# Altium footprint library 集大电协1.5.PcbLib: 283 footprints (part 10 of 18)
Each footprint in its own frame and in the unit in brackets; x right, y up, seen from the top. Pads: shape width x height; smd on the part's side, far side on the other; paste and mask are expansions set on the pad; w line width, h text height; cw(c..) or ccw(c..) is an arc to the next point about the centre after c.
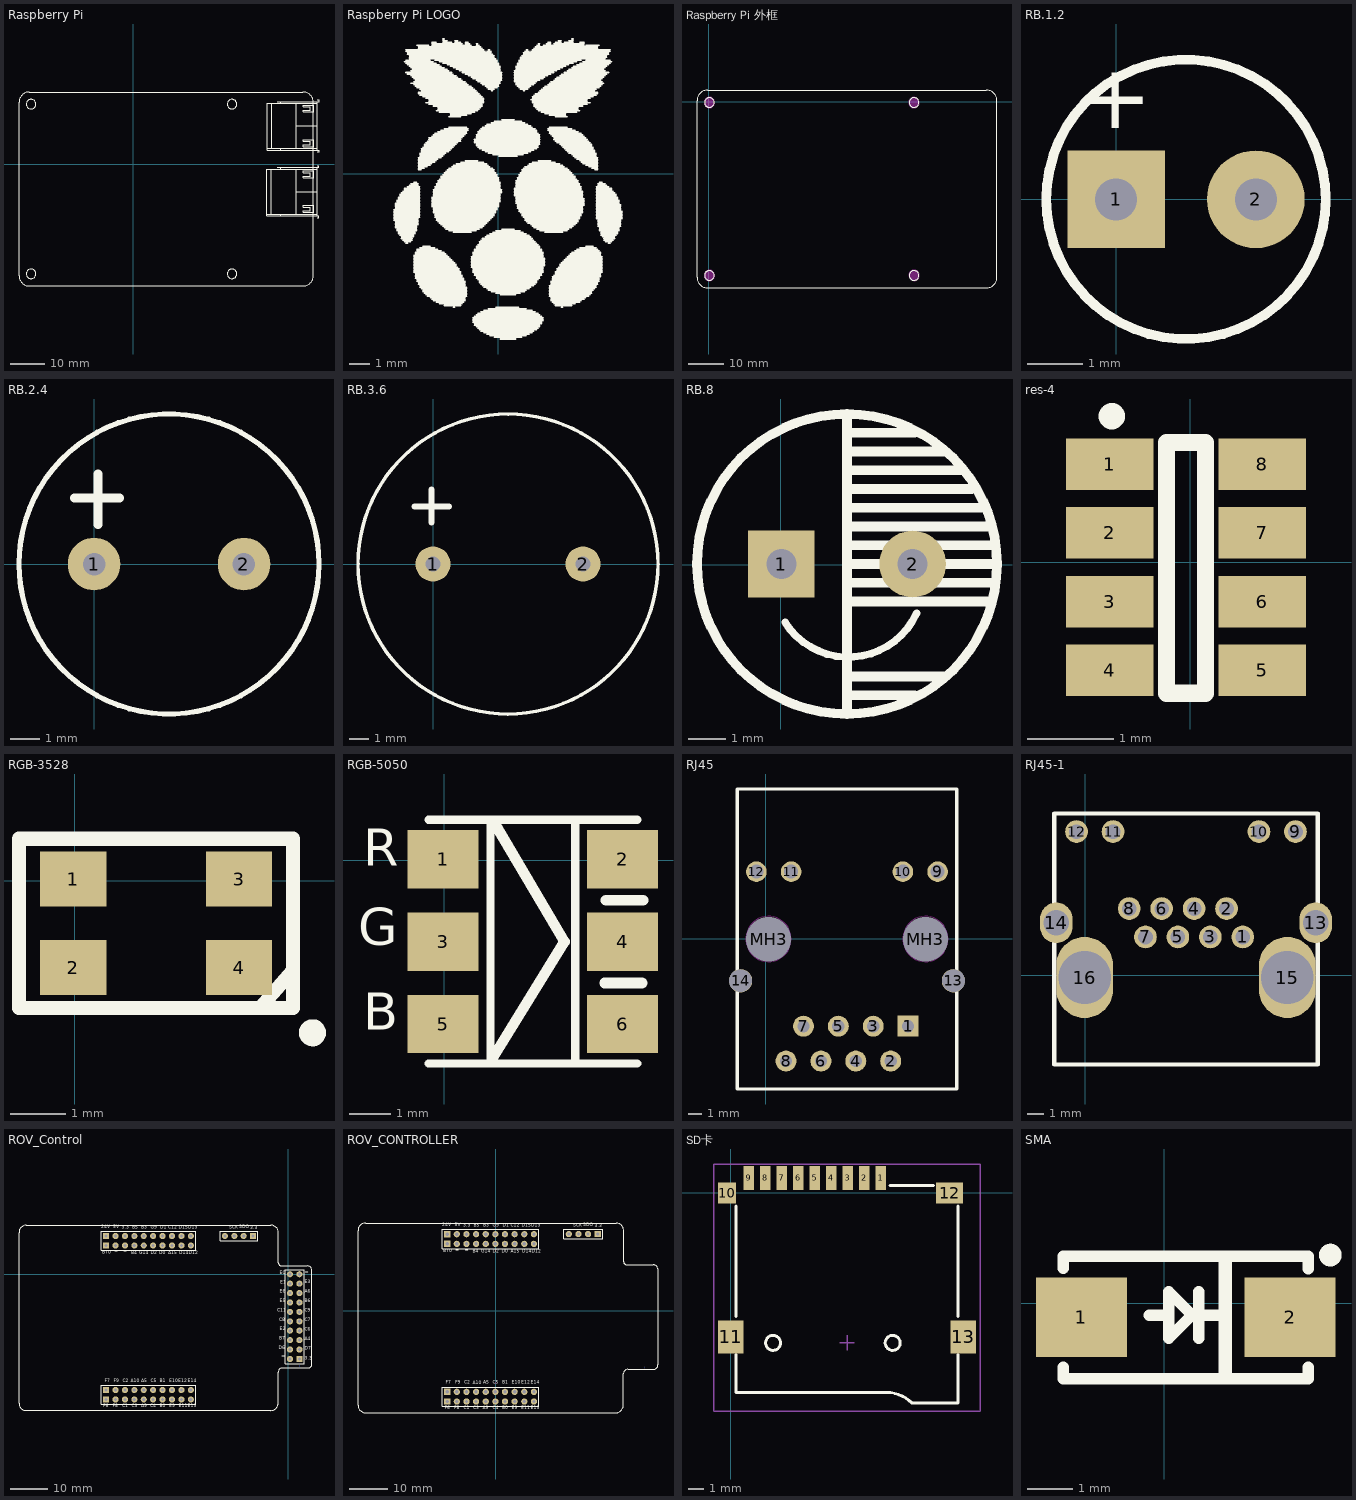
[diagram p9: the footprints below, top view; thin cyan lines are the x and y axes]

## Raspberry Pi [mm]
Top Overlay:
  circle w0.254: c28.556,-31.719 r1.375
  circle w0.254: c-29.444,17.281 r1.375
  circle w0.254: c-29.444,-31.719 r1.375
  circle w0.254: c28.556,17.281 r1.375
  lines w0.1: 38.606,-14.465 42.606,-14.465 ; 38.681,4.535 42.681,4.535 ; 39.906,-14.465 39.906,-1.465 ; 39.981,4.535 39.981,17.535 ; 41.606,-0.965 53.106,-0.965 ; 41.681,18.035 53.181,18.035 ; 42.606,-14.965 42.606,-14.465 ; 42.606,-0.965 42.606,-1.465 53.106,-1.465 39.906,-1.465 ; 42.681,4.035 42.681,4.535 ; 42.681,18.035 42.681,17.535 53.181,17.535 39.981,17.535 ; 47.106,-14.465 47.106,-1.465 ; 47.106,-7.965 53.106,-7.965 53.106,-0.965 ; 47.181,4.535 47.181,17.535 ; 47.181,11.035 53.181,11.035 53.181,18.035 ; 53.106,-15.465 53.606,-15.465 53.606,-14.965 53.106,-14.965 ; 53.106,-14.465 42.606,-14.465 ; 53.106,-0.465 53.606,-0.465 53.606,-0.965 53.106,-0.965 ; 53.181,3.535 53.681,3.535 53.681,4.035 53.181,4.035 ; 53.181,4.535 42.681,4.535 ; 53.181,18.535 53.681,18.535 53.681,18.035 53.181,18.035 ; 39.906,-1.465 38.606,-1.465 38.606,-7.965 38.606,-14.965 53.106,-14.965 ; 39.981,17.535 38.681,17.535 38.681,11.035 38.681,4.035 53.181,4.035 ; 53.106,-14.965 53.106,-0.965 ; 53.181,4.035 53.181,18.035 ; 49.106,-13.965 49.106,-13.465 51.106,-13.465 51.106,-12.465 49.106,-12.465 49.106,-11.965 52.106,-11.965 52.106,-13.465 52.106,-13.965 49.106,-13.965 ; 49.106,-3.965 49.106,-3.465 51.106,-3.465 51.106,-2.465 49.106,-2.465 49.106,-1.965 52.106,-1.965 52.106,-3.465 52.106,-3.965 49.106,-3.965 ; 49.181,5.035 52.181,5.035 52.181,5.535 52.181,7.035 49.181,7.035 49.181,6.535 51.181,6.535 51.181,5.535 49.181,5.535 49.181,5.035 ; 49.181,15.035 52.181,15.035 52.181,15.535 52.181,17.035 49.181,17.035 49.181,16.535 51.181,16.535 51.181,15.535 49.181,15.535 49.181,15.035
  lines w0.254: -32.944,-32.219 ccw(c-29.944,-32.219) -29.944,-35.219 49.056,-35.219 ccw(c49.056,-32.219) 52.056,-32.219 52.056,17.781 ccw(c49.056,17.781) 49.056,20.781 -29.944,20.781 ccw(c-29.944,17.781) -32.944,17.781 -32.944,-32.219

## Raspberry Pi LOGO [mm]
Top Overlay:
  drawing of 575 lines, arcs and shapes, not listed

## Raspberry Pi 外框 [mm]
Top Overlay:
  circle w0.254: c58.173,-49.219 r1.375
  circle w0.254: c0.173,-0.219 r1.375
  circle w0.254: c0.173,-49.219 r1.375
  circle w0.254: c58.173,-0.219 r1.375
  lines w0.254: -3.327,-49.719 ccw(c-0.327,-49.719) -0.327,-52.719 78.673,-52.719 ccw(c78.673,-49.719) 81.673,-49.719 81.673,0.281 ccw(c78.673,0.281) 78.673,3.281 -0.327,3.281 ccw(c-0.327,0.281) -3.327,0.281 -3.327,-49.719
Keep-Out Layer:
  drawing of 8 lines, arcs and shapes, not listed

## RB.1.2 [mil]
pads (2):
  rect 70x70 hole 30: 1(0,0)
  round 70 hole 30: 2(100,0)
Top Overlay:
  circle w7: c50,0 r100
  text "+" at 26,36 h78.74
3D body "CAP_4X7.STEP": height 277.8, standoff -667.09, extent -27.56,-72.83 129.92,84.65

## RB.2.4 [mil]
pads (2):
  round 70 hole 30: 1(0,0) 2(200,0)
Top Overlay:
  circle w7: c100,0 r200
  lines w12: -26,88 34,88 ; 5,53 5,120
3D body "CAP 10.STEP": height 511.81, standoff -543.31, extent -109.65,-218.35 315.94,206.54

## RB.3.6 [mil]
pads (2):
  round 70 hole 30: 1(0,0) 2(300,0)
Top Overlay:
  circle w7: c150,0 r300
  lines w12: -37,115 32,115 ; -3,83 -3,149
3D body "Capacitor Radial Electrolitic.step": height 1575.2, standoff -106.3, extent -203.73,-352.35 504.23,356.3

## RB.8 [mil]
pads (2):
  rect 70x70 / inner round 70 / far side round 70 hole 31.5: 1(0.6,0.53)
  round 70 hole 31.5: 2(138.39,0.53)
Top Overlay:
  circle w10: c69.5,0.53 r157.48
  lines w7.87: 4.48,-60.81 ccw(c70.87,-18.49) 142.48,-51.23
  lines w10: 69.5,-153.02 69.5,154.07 ; 69.5,-137.27 140.44,-137.27 ; 69.5,-117.58 170.44,-117.58 ; 69.5,-38.84 220.44,-38.84 ; 69.5,-19.16 220.44,-19.16 ; 69.5,0.53 226.98,0.53 ; 69.5,20.21 220.44,20.21 ; 69.5,39.9 220.44,39.9 ; 69.5,59.58 210.44,59.58 ; 69.5,79.27 200.44,79.27 ; 69.5,98.95 190.44,98.95 ; 69.5,118.64 170.44,118.64 ; 69.5,138.32 140.44,138.32
3D body "SW3dPS-Cap electro 8x11.5x3.5mm.STEP": height 465.57, standoff -144.78, extent -88.98,-157.94 227.98,159.02

## res-4 [mil] "排阻"
pads (8):
  rect 40x23.62 smd: 1(-37,45) 2(-37,13.5) 3(-37,-17.99) 4(-37,-49.49) 5(33,-49.49) 6(33,-17.99) 7(33,13.5) 8(33,45)
Top Overlay:
  circle w10: c-36,67 r1
  lines w7.87: -11,-60 7,-60 7,55 -11,55 -11,-60
3D body "R1206-4R1-1.step": height 23.14, standoff 0.5, extent -33,-65.99 29.99,59.99

## RGB-3528 [mm]
pads (4):
  rect 1.2x1 smd: 1(-0.029,0.03) 2(-0.029,-1.57) 3(2.971,0.03) 4(2.971,-1.57)
Top Overlay:
  circle w0.254: c4.3,-2.75 r0.117
  lines w0.254: 3.375,-2.275 3.925,-1.65 ; -1.007,-2.301 -1.007,0.758 3.949,0.758 3.949,-2.301 -1.007,-2.301
3D body "User Library-KAA-3528.STEP": height 1.9, standoff 0, extent -0.325,-2.2 3.175,0.6

## RGB-5050 [mm]
pads (6):
  rect 1.7x1.397 smd: 1(-0.022,0.025) 2(4.278,0.025) 3(-0.022,-1.95) 4(4.278,-1.95) 5(-0.022,-3.925) 6(4.278,-3.925)
Top Overlay:
  lines w0.2: -0.372,-4.871 4.628,-4.871 ; -0.372,0.971 4.628,0.971 ; 1.112,-4.871 1.112,0.971 ; 3.144,-4.744 3.144,0.971
  lines w0.254: 1.182,-4.709 2.89,-1.95 1.239,0.844 ; 3.855,-2.94 4.744,-2.94 ; 3.88,-0.959 4.769,-0.959
  text "R" at -1.936,-0.426 h1.52
  text "G" at -2.063,-2.331 h1.52
  text "B" at -1.936,-4.363 h1.52
3D body: height 1.4, standoff -0.15, extent -0.622,-4.41 4.878,0.59

## RJ45 [mm]
pads (16):
  rect 1.524x1.524 hole 0.889: 1(10.38,-6.369)
  round 1.524 hole 0.889: 2(9.11,-8.909) 3(7.84,-6.369) 4(6.57,-8.909) 5(5.3,-6.369) 6(4.03,-8.909) 7(2.76,-6.369) 8(1.49,-8.909)
  round 1.5 hole 1.02: 9(12.53,4.881) 10(9.994,4.881) 11(1.866,4.881) 12(-0.67,4.881)
  round 1.7 hole 1.65: 13(13.68,-3.067) 14(-1.82,-3.067)
  round 2.95 hole 3.25: MH3(0.214,-0.032) MH3(11.644,-0.032)
Top Overlay:
  lines w0.254: -2.07,-10.941 5.93,-10.941 13.93,-10.941 13.93,10.903 5.93,10.903 -2.07,10.903 -2.07,-10.941
Keep-Out Layer:
  circle w0.051: c0.216,-0.019 r1.65
  circle w0.051: c11.646,-0.019 r1.65
Multi-Layer:
  circle w0.127: c11.644,-0.032 r1.798
  circle w0.127: c0.214,-0.032 r1.798
3D body "RJ45 HanRun网口3D封装.STEP": height 14, standoff -2.5, extent -2.093,-10.597 13.787,10.803

## RJ45-1 [mil]
pads (16):
  round 56 hole 36: 1(388,95) 2(348,165) 3(308,95) 4(268,165) 5(228,95) 6(188,165) 7(148,95) 8(108,165) 9(518,355) 10(428,355) 11(68,355) 12(-22,355)
  oval 80x100 hole 63: 13(568,130) 14(-72,130)
  oval 140x200 hole 130: 15(498,-5) 16(-2,-5)
Top Overlay:
  lines w10: -77,-220 -77,400 573,400 573,-220 -77,-220
3D body "ACC-M-RJHSE-5480-REVT1.step": height 567.8, standoff -174.1, extent -135.92,-217 639.92,409

## ROV_Control [mil] "航行器控制中心"
pads (64):
  rect 65x65 hole 34: 1(-1936.07,306.74) 20(-1936.07,407.13) 31(117.59,-898.86) 41(-1936.07,-1329.03) 60(-1936.07,-1228.64) 61(-374.2,408.2)
  round 65 hole 34: 2(-1836.07,306.74) 3(-1736.07,306.74) 4(-1636.07,306.74) 5(-1536.27,306.74) 6(-1436.27,306.74) 8(-1236.46,306.74) 10(-1036.07,306.74) 11(-1036.07,407.13) 13(-1236.46,407.13) 15(-1436.27,407.13) 16(-1536.27,407.13) 17(-1636.07,407.13) 18(-1736.07,407.13) 19(-1836.07,407.13) 21(17.2,1.14) 22(17.2,-98.86) 23(17.2,-198.86) 24(17.2,-298.86) 25(17.2,-398.66) 26(17.2,-498.66) 28(17.2,-698.46) 30(17.2,-898.86) 33(117.59,-698.46) 35(117.59,-498.66) 36(117.59,-398.66) 37(117.59,-298.86) 38(117.59,-198.86) 39(117.59,-98.86) 40(117.59,1.14) 42(-1836.07,-1329.03) 43(-1736.07,-1329.03) 44(-1636.07,-1329.03) 45(-1536.27,-1329.03) 46(-1436.27,-1329.03) 48(-1236.46,-1329.03) 50(-1036.07,-1329.03) 51(-1036.07,-1228.64) 53(-1236.46,-1228.64) 55(-1436.27,-1228.64) 56(-1536.27,-1228.64) 57(-1636.07,-1228.64) 58(-1736.07,-1228.64) 59(-1836.07,-1228.64) 62(-474.2,408.2) 63(-574.2,408.2) 64(-674.2,408.2)
  round 65 hole 34 paste+0: 7(-1336.46,306.74) 9(-1136.07,306.74) 12(-1136.07,407.13) 14(-1336.46,407.13) 27(17.2,-598.46) 29(17.2,-798.86) 32(117.59,-798.86) 34(117.59,-598.46) 47(-1336.46,-1329.03) 49(-1136.07,-1329.03) 52(-1136.07,-1228.64) 54(-1336.46,-1228.64)
Bottom Layer:
  region: 115.18,-967.46 115.18,-982.46
  region: 115.18,-967.46 115.18,-982.46
  region: 115.18,-967.46 115.18,-982.46
Top Overlay:
  lines w7.87: -1986.07,-1279.03 -1986.07,-1379.03 -984.5,-1379.03 -984.5,-1279.03 ; -1986.07,-1278.64 -1986.07,-1178.64 -984.5,-1178.64 -984.5,-1278.64 ; -1986.07,356.74 -1986.07,256.74 -984.5,256.74 -984.5,356.74 ; -1986.07,357.13 -1986.07,457.13 -984.5,457.13 -984.5,357.13 ; 67.2,-950.43 -32.8,-950.43 -32.8,51.14 67.2,51.14 ; 67.59,-950.43 167.59,-950.43 167.59,51.14 67.59,51.14 ; -724.2,358.2 -324.2,358.2 -324.2,458.2 -724.2,458.2 -724.2,358.2
  lines w10: -187.22,-1446.42 ccw(c-187.22,-1367.68) -108.48,-1367.68 ; -184.3,-1446.16 -2782.72,-1446.16 cw(c-2782.72,-1367.42) -2861.46,-1367.42 -2861.46,443.61 cw(c-2782.72,443.61) -2782.72,522.35 -184.3,522.35 cw(c-184.3,443.61) -105.56,443.61 -105.56,122.82 ccw(c-72.27,122.82) -72.27,89.54 202.75,89.54 cw(c202.75,41.1) 251.18,41.1 251.18,-949.15 cw(c205.87,-949.15) 205.87,-994.46 -58.82,-994.46 ; -108.48,-1366.69 -108.48,-1040.48 ; -108.48,-1041.46 cw(c-61.74,-1041.46) -61.74,-994.72
  text "G9" at -1463,468.89 h60
  text "G14" at -1585,197.54 h60
  text "3.3" at -1767.82,468.33 h60
  text "3.3" at 173.18,-920.46 h60
  text "-" at 175.72,-39.47 h150
  text "E2" at -90.72,-610.98 h60
  text "B7" at -96.6,-711.97 h60
  text "E0" at -91.83,-13.47 h60
  text "E1" at -84.78,-113.01 h60
  text "E3" at 175.58,-112.85 h60
  text "A6" at 175.63,-213.3 h60
  text "E6" at -91.83,-211.45 h60
  text "E5" at -90.72,-313.44 h60
  text "B6" at 175.58,-313.75 h60
  text "C11" at -117.82,-411.46 h60
  text "C9" at 175.63,-414.21 h60
  text "C8" at -98.49,-513.43 h60
  text "C7" at 175.63,-514.66 h60
  text "C6" at 175.63,-615.11 h60
  text "A4" at 175.63,-716.12 h60
  text "D7" at 175.58,-816.57 h60
  text "E14" at -1070.82,-1162.46 h60
  text "E12" at -1168.82,-1162.46 h60
  text "E10" at -1266.82,-1162.46 h60
  text "B1" at -1364.82,-1162.46 h60
  text "A5" at -1560.76,-1161.69 h60
  text "A10" at -1671.82,-1163.46 h60
  text "F9" at -1854.82,-1162.3 h60
  text "F7" at -1952.82,-1161.69 h60
  text "C2" at -1756.76,-1162.3 h60
  text "C5" at -1462.76,-1162.3 h60
  text "A15" at -1275,197.54 h60
  text "D14" at -1159.82,196.98 h60
  text "D12" at -1057.82,196.98 h60
  text "D13" at -1062.82,468.89 h60
  text "D15" at -1164.82,468.89 h60
  text "C12" at -1277,468.89 h60
  text "D1" at -1359,468.33 h60
  text "D0" at -1370,197 h60
  text "D2" at -1463,197 h60
  text "B4" at -1669.82,196.98 h60
  text "B3" at -1560.32,468.89 h60
  text "B5" at -1659.82,468.89 h60
  text "-" at -1755.91,180.47 h150
  text "-" at -1851.82,180.47 h150
  text "BT0" at -1976.82,202.54 h60
  text "5V" at -1858.82,473.89 h60
  text "24V" at -1986.22,473.33 h60
  text "C4" at -1465.43,-1425.3 h60
  text "C3" at -1664.76,-1425.3 h60
  text "C1" at -1764.43,-1425.46 h60
  text "E13" at -1066.82,-1425.46 h60
  text "E11" at -1166.49,-1425.46 h60
  text "E9" at -1266.15,-1425.3 h60
  text "B0" at -1365.82,-1425.3 h60
  text "A9" at -1565.1,-1425.46 h60
  text "F8" at -1864.15,-1425.3 h60
  text "F6" at -1963.82,-1425.3 h60
  text "SDO" at -521.82,471.52 h60
  text "SCK" at -629.82,470.52 h60
  text "3.3" at -406.82,465.52 h60
  text "-" at -693.82,454.52 h150
  text "-" at -76.1,-931.46 h150
  text "D6" at -101.76,-812.41 h60
3D body "Samtec-SSW-101-01-F-D.step": height 335, standoff -104, extent -31.73,-60.71 163.27,59.29
3D body "Samtec-SSW-101-01-F-D.step": height 335, standoff -104, extent -31.73,-160.71 163.27,-40.71
3D body "Samtec-SSW-101-01-F-D.step": height 335, standoff -104, extent -31.73,-260.71 163.27,-140.71
3D body "Samtec-SSW-101-01-F-D.step": height 335, standoff -104, extent -31.73,-360.71 163.27,-240.71
3D body "Samtec-SSW-101-01-F-D.step": height 335, standoff -104, extent -31.73,-460.71 163.27,-340.71
3D body "Samtec-SSW-101-01-F-D.step": height 335, standoff -104, extent -31.73,-560.71 163.27,-440.71
3D body "Samtec-SSW-101-01-F-D.step": height 335, standoff -104, extent -31.73,-660.71 163.27,-540.71
3D body "Samtec-SSW-101-01-F-D.step": height 335, standoff -104, extent -31.73,-760.71 163.27,-640.71
3D body "Samtec-SSW-101-01-F-D.step": height 335, standoff -104, extent -31.73,-860.71 163.27,-740.71
3D body "Samtec-SSW-101-01-F-D.step": height 335, standoff -104, extent -31.73,-960.71 163.27,-840.71
3D body "Samtec-SSW-101-01-F-D.step": height 335, standoff -104, extent -1095.16,257.01 -975.16,452.01
3D body "Samtec-SSW-101-01-F-D.step": height 335, standoff -104, extent -1195.16,257.01 -1075.16,452.01
3D body "Samtec-SSW-101-01-F-D.step": height 335, standoff -104, extent -1295.16,257.01 -1175.16,452.01
3D body "Samtec-SSW-101-01-F-D.step": height 335, standoff -104, extent -1395.16,257.01 -1275.16,452.01
3D body "Samtec-SSW-101-01-F-D.step": height 335, standoff -104, extent -1495.16,257.01 -1375.16,452.01
3D body "Samtec-SSW-101-01-F-D.step": height 335, standoff -104, extent -1595.16,257.01 -1475.16,452.01
3D body "Samtec-SSW-101-01-F-D.step": height 335, standoff -104, extent -1695.16,257.01 -1575.16,452.01
3D body "Samtec-SSW-101-01-F-D.step": height 335, standoff -104, extent -1795.16,257.01 -1675.16,452.01
3D body "Samtec-SSW-101-01-F-D.step": height 335, standoff -104, extent -1895.16,257.01 -1775.16,452.01
3D body "Samtec-SSW-101-01-F-D.step": height 335, standoff -104, extent -1995.16,257.01 -1875.16,452.01
3D body "Samtec-SSW-101-01-F-D.step": height 335, standoff -104, extent -1094.18,-1376.85 -974.18,-1181.85
3D body "Samtec-SSW-101-01-F-D.step": height 335, standoff -104, extent -1194.18,-1376.85 -1074.18,-1181.85
3D body "Samtec-SSW-101-01-F-D.step": height 335, standoff -104, extent -1294.18,-1376.85 -1174.18,-1181.85
3D body "Samtec-SSW-101-01-F-D.step": height 335, standoff -104, extent -1394.18,-1376.85 -1274.18,-1181.85
3D body "Samtec-SSW-101-01-F-D.step": height 335, standoff -104, extent -1494.18,-1376.85 -1374.18,-1181.85
3D body "Samtec-SSW-101-01-F-D.step": height 335, standoff -104, extent -1594.18,-1376.85 -1474.18,-1181.85
3D body "Samtec-SSW-101-01-F-D.step": height 335, standoff -104, extent -1694.18,-1376.85 -1574.18,-1181.85
3D body "Samtec-SSW-101-01-F-D.step": height 335, standoff -104, extent -1794.18,-1376.85 -1674.18,-1181.85
3D body "Samtec-SSW-101-01-F-D.step": height 335, standoff -104, extent -1894.18,-1376.85 -1774.18,-1181.85
3D body "Samtec-SSW-101-01-F-D.step": height 335, standoff -104, extent -1994.18,-1376.85 -1874.18,-1181.85
3D body "HDR2.54-1P_M.STEP": height 334.65, standoff -118.11, extent -524.6,356.49 -424.6,456.49
3D body "HDR2.54-1P_M.STEP": height 334.65, standoff -118.11, extent -424.6,356.49 -324.6,456.49
3D body "HDR2.54-1P_M.STEP": height 334.65, standoff -118.11, extent -724.6,356.49 -624.6,456.49
3D body "HDR2.54-1P_M.STEP": height 334.65, standoff -118.11, extent -624.6,356.49 -524.6,456.49

## ROV_CONTROLLER [mil]
pads (44):
  rect 65x65 hole 34: 1(-502.07,694.74) 20(-502.07,795.13) 41(-502.07,-941.03) 60(-502.07,-840.64) 61(1059.8,796.2)
  round 65 hole 34: 2(-402.07,694.74) 3(-302.07,694.74) 4(-202.07,694.74) 5(-102.27,694.74) 6(-2.27,694.74) 8(197.54,694.74) 10(397.93,694.74) 11(397.93,795.13) 13(197.54,795.13) 15(-2.27,795.13) 16(-102.27,795.13) 17(-202.07,795.13) 18(-302.07,795.13) 19(-402.07,795.13) 42(-402.07,-941.03) 43(-302.07,-941.03) 44(-202.07,-941.03) 45(-102.27,-941.03) 46(-2.27,-941.03) 48(197.54,-941.03) 50(397.93,-941.03) 51(397.93,-840.64) 53(197.54,-840.64) 55(-2.27,-840.64) 56(-102.27,-840.64) 57(-202.07,-840.64) 58(-302.07,-840.64) 59(-402.07,-840.64) 62(959.8,796.2) 63(859.8,796.2) 64(759.8,796.2)
  round 65 hole 34 paste+0: 7(97.54,694.74) 9(297.93,694.74) 12(297.93,795.13) 14(97.54,795.13) 47(97.54,-941.03) 49(297.93,-941.03) 52(297.93,-840.64) 54(97.54,-840.64)
Bottom Layer:
  region: 1549.18,-579.46 1549.18,-594.46
  region: 1549.18,-579.46 1549.18,-594.46
  region: 1549.18,-579.46 1549.18,-594.46
Top Overlay:
  lines w7.87: -552.07,-891.03 -552.07,-991.03 449.5,-991.03 449.5,-891.03 ; -552.07,-890.64 -552.07,-790.64 449.5,-790.64 449.5,-890.64 ; -552.07,744.74 -552.07,644.74 449.5,644.74 449.5,744.74 ; -552.07,745.13 -552.07,845.13 449.5,845.13 449.5,745.13 ; 709.8,746.2 709.8,846.2 1109.8,846.2 1109.8,746.2 709.8,746.2
  lines w10: 1246.78,-1058.42 ccw(c1246.78,-979.68) 1325.52,-979.68 ; 1249.7,-1058.16 -1348.72,-1058.16 cw(c-1348.72,-979.42) -1427.46,-979.42 -1427.46,831.61 cw(c-1348.72,831.61) -1348.72,910.35 1249.7,910.35 cw(c1249.7,831.61) 1328.44,831.61 1328.44,510.82 ccw(c1361.73,510.82) 1361.73,477.54 1636.75,477.54 cw(c1636.75,429.1) 1685.18,429.1 1685.18,-561.15 cw(c1639.87,-561.15) 1639.87,-606.46 1375.18,-606.46 ; 1325.52,-978.69 1325.52,-652.48 ; 1325.52,-653.46 cw(c1372.26,-653.46) 1372.26,-606.72
  text "-" at 740.18,842.52 h150
  text "3.3" at 1027.18,853.52 h60
  text "SCK" at 804.18,858.52 h60
  text "SDO" at 912.18,859.52 h60
  text "F6" at -529.82,-1037.3 h60
  text "F8" at -430.15,-1037.3 h60
  text "A9" at -131.1,-1037.46 h60
  text "B0" at 68.18,-1037.3 h60
  text "E9" at 167.85,-1037.3 h60
  text "E11" at 267.51,-1037.46 h60
  text "E13" at 367.18,-1037.46 h60
  text "C1" at -330.43,-1037.46 h60
  text "C3" at -230.76,-1037.3 h60
  text "C4" at -31.43,-1037.3 h60
  text "24V" at -552.22,861.33 h60
  text "5V" at -424.82,861.89 h60
  text "BT0" at -542.82,590.54 h60
  text "-" at -417.82,568.47 h150
  text "-" at -321.91,568.47 h150
  text "B5" at -225.82,856.89 h60
  text "B3" at -126.32,856.89 h60
  text "B4" at -235.82,584.98 h60
  text "D2" at -29,585 h60
  text "D0" at 64,585 h60
  text "D1" at 75,856.33 h60
  text "C12" at 157,856.89 h60
  text "D15" at 269.18,856.89 h60
  text "D13" at 371.18,856.89 h60
  text "D12" at 376.18,584.98 h60
  text "D14" at 274.18,584.98 h60
  text "A15" at 159,585.54 h60
  text "C5" at -28.76,-774.3 h60
  text "C2" at -322.76,-774.3 h60
  text "F7" at -518.82,-773.69 h60
  text "F9" at -420.82,-774.3 h60
  text "A10" at -237.82,-775.46 h60
  text "A5" at -126.76,-773.69 h60
  text "B1" at 69.18,-774.46 h60
  text "E10" at 167.18,-774.46 h60
  text "E12" at 265.18,-774.46 h60
  text "E14" at 363.18,-774.46 h60
  text "3.3" at -333.82,856.33 h60
  text "G14" at -151,585.54 h60
  text "G9" at -29,856.89 h60
3D body "HDR2.54-1P_M.STEP": height 334.65, standoff -118.11, extent 809.4,744.49 909.4,844.49
3D body "HDR2.54-1P_M.STEP": height 334.65, standoff -118.11, extent 709.4,744.49 809.4,844.49
3D body "HDR2.54-1P_M.STEP": height 334.65, standoff -118.11, extent 1009.4,744.49 1109.4,844.49
3D body "HDR2.54-1P_M.STEP": height 334.65, standoff -118.11, extent 909.4,744.49 1009.4,844.49
3D body "Samtec-SSW-101-01-F-D.step": height 335, standoff -104, extent -560.18,-988.85 -440.18,-793.85
3D body "Samtec-SSW-101-01-F-D.step": height 335, standoff -104, extent -460.18,-988.85 -340.18,-793.85
3D body "Samtec-SSW-101-01-F-D.step": height 335, standoff -104, extent -360.18,-988.85 -240.18,-793.85
3D body "Samtec-SSW-101-01-F-D.step": height 335, standoff -104, extent -260.18,-988.85 -140.18,-793.85
3D body "Samtec-SSW-101-01-F-D.step": height 335, standoff -104, extent -160.18,-988.85 -40.18,-793.85
3D body "Samtec-SSW-101-01-F-D.step": height 335, standoff -104, extent -60.18,-988.85 59.82,-793.85
3D body "Samtec-SSW-101-01-F-D.step": height 335, standoff -104, extent 39.82,-988.85 159.82,-793.85
3D body "Samtec-SSW-101-01-F-D.step": height 335, standoff -104, extent 139.82,-988.85 259.82,-793.85
3D body "Samtec-SSW-101-01-F-D.step": height 335, standoff -104, extent 239.82,-988.85 359.82,-793.85
3D body "Samtec-SSW-101-01-F-D.step": height 335, standoff -104, extent 339.82,-988.85 459.82,-793.85
3D body "Samtec-SSW-101-01-F-D.step": height 335, standoff -104, extent -561.16,645.01 -441.16,840.01
3D body "Samtec-SSW-101-01-F-D.step": height 335, standoff -104, extent -461.16,645.01 -341.16,840.01
3D body "Samtec-SSW-101-01-F-D.step": height 335, standoff -104, extent -361.16,645.01 -241.16,840.01
3D body "Samtec-SSW-101-01-F-D.step": height 335, standoff -104, extent -261.16,645.01 -141.16,840.01
3D body "Samtec-SSW-101-01-F-D.step": height 335, standoff -104, extent -161.16,645.01 -41.16,840.01
3D body "Samtec-SSW-101-01-F-D.step": height 335, standoff -104, extent -61.16,645.01 58.84,840.01
3D body "Samtec-SSW-101-01-F-D.step": height 335, standoff -104, extent 38.84,645.01 158.84,840.01
3D body "Samtec-SSW-101-01-F-D.step": height 335, standoff -104, extent 138.84,645.01 258.84,840.01
3D body "Samtec-SSW-101-01-F-D.step": height 335, standoff -104, extent 238.84,645.01 358.84,840.01
3D body "Samtec-SSW-101-01-F-D.step": height 335, standoff -104, extent 338.84,645.01 458.84,840.01

## SD卡 [mm]
pads (13):
  rect 0.7x1.6 smd: 1(10.022,1) 2(8.922,1) 3(7.822,1) 4(6.722,1) 5(5.622,1) 6(4.522,1) 7(3.422,1) 8(2.322,1) 9(1.222,1)
  rect 1.2x1.4 smd: 10(-0.232,-0.008)
  rect 1.7x2.2 smd: 11(0.022,-9.608) 13(15.522,-9.608)
  rect 1.8x1.4 smd: 12(14.622,-0.008)
Top Overlay:
  circle w0.2: c2.842,-10.008 r0.5
  circle w0.2: c10.822,-10.008 r0.5
  lines w0.2: 0.372,-10.77 0.372,-13.308 8.788,-13.308 ; 0.372,-8.23 0.372,-0.864 ; 8.534,-13.308 10.4,-13.308 cw(c10.4,-15.698) 12.09,-14.008 15.172,-14.008 15.172,-10.77 ; 10.652,0.492 13.528,0.492 ; 15.172,-8.23 15.172,-0.864
Mechanical 15:
  lines w0.1: 7.272,-10.008 8.272,-10.008 ; 7.772,-10.508 7.772,-9.508 ; -1.118,-14.58 16.662,-14.58 16.662,1.93 -1.118,1.93 -1.118,-14.58
3D body "tf_card_1.stp": height 2.15, standoff -0.3, extent -0.277,-16.27 15.823,1.029

## SMA [mm] "二极管"
pads (2):
  rect 2x1.75 smd: 1(-1.829,-0.305) 2(2.771,-0.305)
Top Overlay:
  circle w0.25: c3.658,1.067 r0.125
  lines w0.254: -2.229,-1.41 -2.229,-1.655 3.171,-1.655 3.171,-1.405 ; -2.229,0.775 -2.229,1.045 3.166,1.045 ; -0.33,-0.254 0,-0.254 ; 0.762,-0.762 0.762,0.254 ; 0.762,-0.254 1.27,-0.254 ; 3.171,0.77 3.171,1.045 ; 0.102,-0.762 0.102,0.254 0.61,-0.254 0.102,-0.762
  lines w0.3: 1.345,-1.605 1.345,0.995
3D body "SMA.STEP": height 2.15, standoff 0.04, extent -2.057,-1.63 3.046,0.97